# Altium footprint library NG2092.PcbLib: 32 footprints (part 1 of 2)
Each footprint in its own frame and in the unit in brackets; x right, y up, seen from the top. Pads: shape width x height; smd on the part's side, far side on the other; paste and mask are expansions set on the pad; w line width, h text height; cw(c..) or ccw(c..) is an arc to the next point about the centre after c.
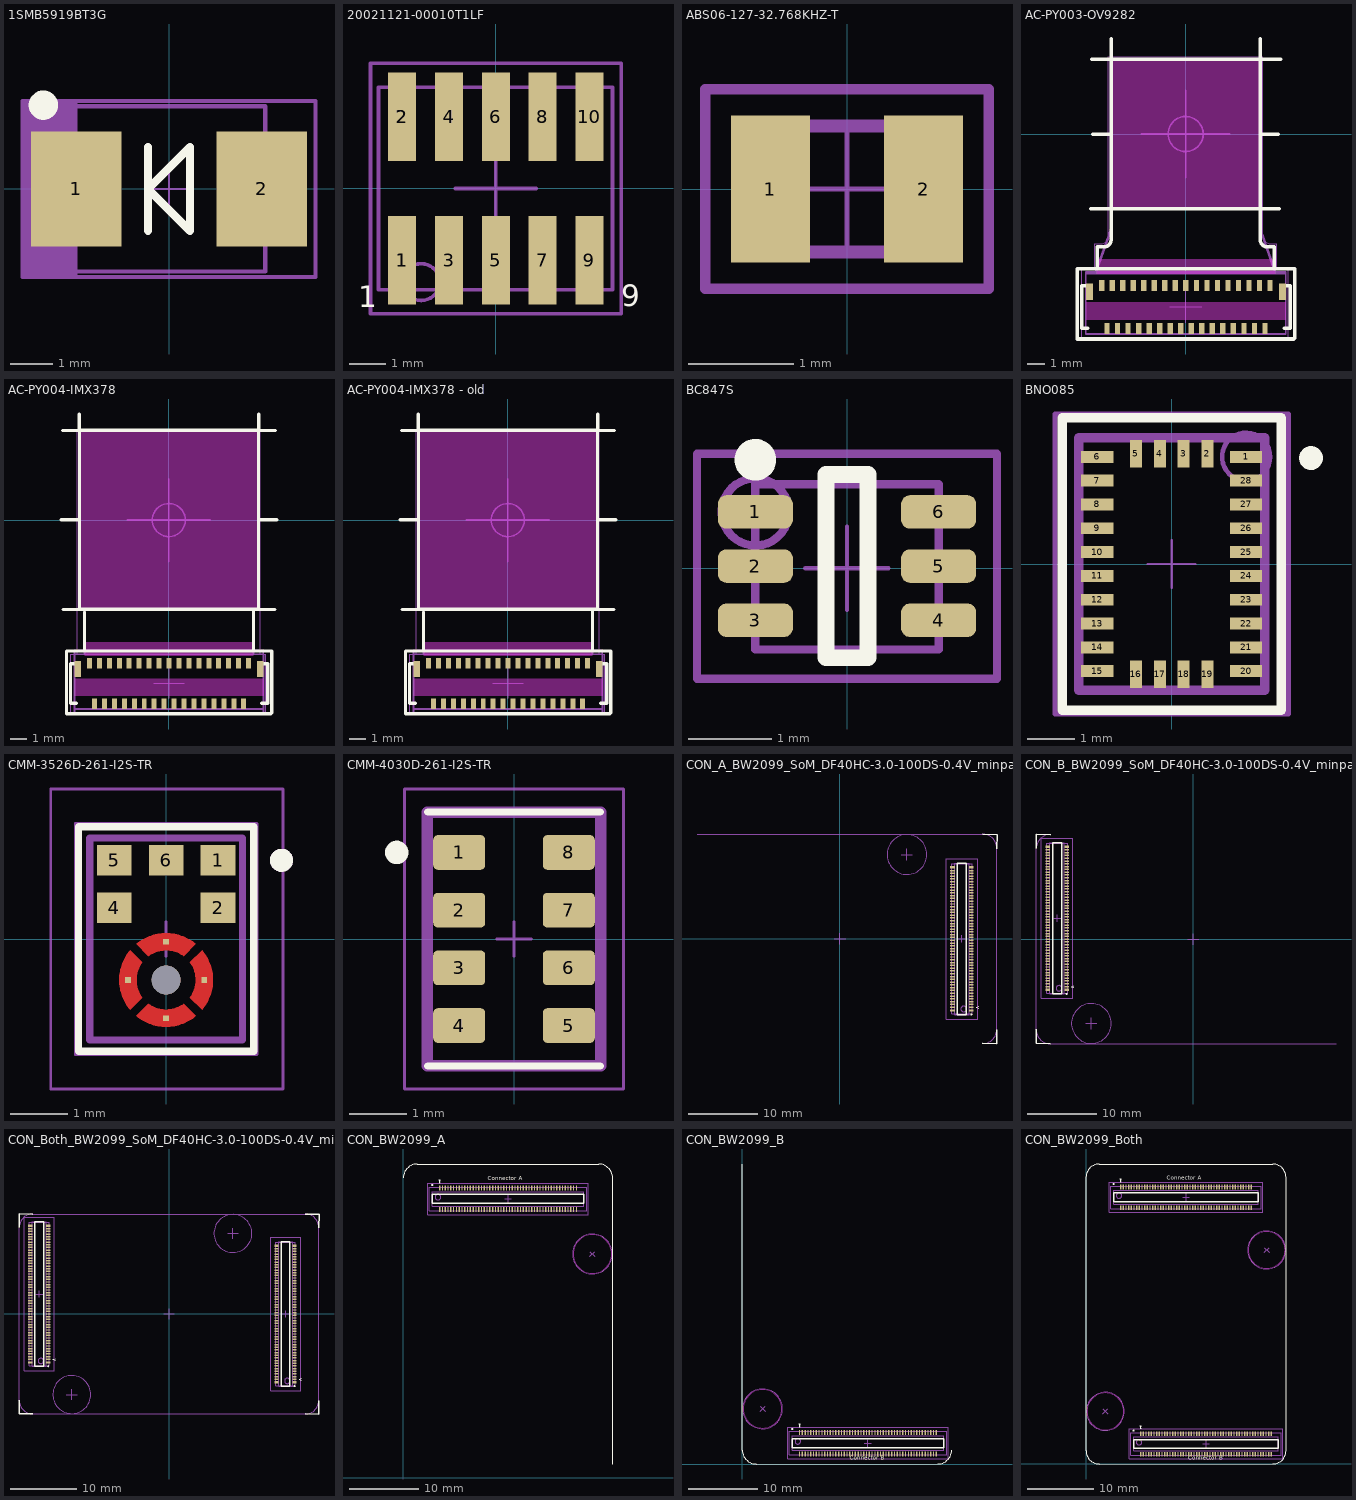
[diagram p0: the footprints below, top view; thin cyan lines are the x and y axes]

## 1SMB5919BT3G [mm] "Molded, 2-Leads, Body 4.6x3.95mm"
height 2.42
pads (2):
  rect 2.159x2.743 smd: 1(-2.21,0) 2(2.21,0)
Top Overlay:
  circle w0.5: c-3,2 r0.1
  lines w0.2: -0.5,-1 -0.5,0 ; -0.5,0 -0.5,1 -0.5,0 ; -0.5,0 0.5,1 ; -0.5,0 0.5,-1 0.5,0 ; 0.5,0 0.5,1 ; 0.5,0 0.5,1
Top Assembly:
  rectangle: -3.5,-2.106 -2.181,2.102
  lines w0.1: -3.5,-2.1 3.5,-2.1 3.5,2.1 -3.5,2.1 -3.5,-2.1
  text "'.Designator'" at -2.418,-0.227 h1
Top Courtyard (Mech15):
  lines w0.05: -0.5,0 0.5,0 ; 0,-0.5 0,0.5 ; -3.5,-2.1 3.486,-2.1 3.486,2.1 -3.5,2.1 -3.5,-2.1
Top Component Outline (Mech31):
  lines w0.1: -2.3,-1.975 2.3,-1.975 2.3,1.975 -2.3,1.975 -2.3,-1.975
3D body: height 2.42, standoff 0, extent -2.3,-1.975 2.3,1.975

## 20021121-00010T1LF [mm] "Connector Header Surface Mount 10 position 0.050\" (1.27mm)   Contact length: 0.120\" (3.05mm)"
height 4
pads (12):
  rect 0.76x2.4 smd: 1(-2.54,-1.95) 1(-2.54,-1.95) 2(-2.54,1.95) 2(-2.54,1.95) 3(-1.27,-1.95) 4(-1.27,1.95) 5(0,-1.95) 6(0,1.95) 7(1.27,-1.95) 8(1.27,1.95) 9(2.54,-1.95) 10(2.54,1.95)
Top Overlay:
  text "1" at -3.737,-3.429 h1
  text "9" at 3.4,-3.4 h1
Top Assembly:
  lines w0.1: -3.4,-3.4 3.4,-3.4 3.4,3.4 -3.4,3.4 -3.4,-3.4 ; -1.524,-2.54 ccw(c-2.024,-2.54) -1.524,-2.54
  text "'.Designator'" at -2.418,-0.227 h1
Top Courtyard (Mech15):
  lines w0.05: -3.4,-3.4 -3.4,3.4 3.4,3.4 3.4,-3.4 -3.4,-3.4
  lines w0.1: -1.1,0 0,0 ; 0,-1.1 0,0 ; 0,1.1 0,0 ; 1.1,0 0,0
Top Component Outline (Mech31):
  lines w0.1: -3.184,-2.75 -3.184,2.75 3.166,2.75 3.166,-2.75 -3.184,-2.75
3D body "20021121-00010T1LF.stp": height 4.55, standoff 0, extent -3.184,-2.75 3.166,2.75

## ABS06-127-32.768KHZ-T [mm] "2-SMD 0.079\" L x 0.047\" W (2.00mm x 1.20mm)"
height 0.6
pads (2):
  rect 0.75x1.4 smd: 1(-0.73,0) 2(0.73,0)
Top Assembly:
  lines w0.1: -1.35,-0.95 1.35,-0.95 1.35,0.95 -1.35,0.95 -1.35,-0.95
  text "'.Designator'" at -2.418,-0.227 h1
Top Courtyard (Mech15):
  lines w0.05: -0.6,0 0,0 ; 0,-0.6 0,0 ; 0,0.6 0,0 ; 0.6,0 0,0 ; -1.35,-0.95 1.35,-0.95 1.35,0.95 -1.35,0.95 -1.35,-0.95
Top Component Outline (Mech31):
  lines w0.127: -1,-0.6 1,-0.6 1,0.6 -1,0.6 -1,-0.6
3D body "ABS06-32.768KHZ-9-T--3DModel-STEP-56544.STEP": height 0.65, standoff 0.05, extent -1,-0.6 1,0.6

## AC-PY003-OV9282 [mm] "connector: FH26W-33S-0.3SHW"
pads (35):
  rect 0.4x0.95 smd mask+0.05: 0(-5.488,-8.984) 0(5.512,-8.984)
  rect 0.3x0.65 smd mask+0.05: 1(4.812,-8.634) 2(4.52,-11.084) 3(4.212,-8.634) 4(3.92,-11.084) 5(3.612,-8.634) 6(3.32,-11.084) 7(3.012,-8.634) 8(2.72,-11.084) 9(2.412,-8.634) 10(2.12,-11.084) 11(1.812,-8.634) 12(1.52,-11.084) 13(1.212,-8.634) 14(0.92,-11.084) 15(0.612,-8.634) 16(0.32,-11.084) 17(0.012,-8.634) 18(-0.28,-11.084) 19(-0.588,-8.634) 20(-0.88,-11.084) 21(-1.188,-8.634) 22(-1.48,-11.084) 23(-1.788,-8.634) 24(-2.08,-11.084) 25(-2.388,-8.634) 26(-2.68,-11.084) 27(-2.988,-8.634) 28(-3.28,-11.084) 29(-3.588,-8.634) 30(-3.88,-11.084) 31(-4.188,-8.634) 32(-4.48,-11.084) 33(-4.788,-8.634)
Top Layer keep-out:
  rectangle: -5.088,-7.981 5.131,-7.138
  rectangle: -5.688,-10.602 5.73,-9.573
  rectangle: -4.2,-4.2 4.3,4.2
Top Overlay:
  lines w0.2: -6.175,-7.684 -6.175,-11.684 6.162,-11.684 6.215,-11.632 6.215,-7.684 -6.148,-7.684 ; -5.575,-11.059 -5.925,-11.059 -5.925,-8.659 -5.575,-8.659 ; -5.412,-4.25 5.348,-4.25 ; -5.348,4.25 5.412,4.25 ; -5.288,0 -4.288,0 ; -5.043,-7.684 -5.043,-6.431 -4.669,-6.431 ccw(c-4.65,-6.031) -4.25,-6.05 -4.25,5.416 ; 4.252,5.416 4.252,-6.05 ccw(c4.652,-6.031) 4.671,-6.431 5.046,-6.431 5.046,-7.684 ; 4.288,0 5.288,0 ; 5.615,-11.059 5.965,-11.059 5.965,-8.659 5.615,-8.659
Top Assembly:
  circle w0.1: c0,0 r1
  lines w0.1: -2.51,0 2.51,0 ; 0,-2.5 0,2.5 ; -5.688,-11.397 -5.688,-7.859 -2.738,-7.859 2.762,-7.859 5.7,-7.859 5.7,-11.397 -5.688,-11.397
  lines w0.15: -5.112,-7.882 -4.25,-5.408 ; -4.248,-5.408 -4.248,-4.246 ; 4.248,-5.41 4.248,-4.248 ; 4.25,-5.41 5.112,-7.884 ; 4.252,4.25 -4.252,4.25 -4.252,-4.248 4.252,-4.248 4.252,4.252
  text "'.Designator'" at -2.418,-9.977 h1
Top Courtyard (Mech15):
  lines w0.05: -5.193,-7.656 -5.193,-6.246 -4.819,-6.246 ccw(c-4.8,-5.847) -4.4,-5.866 -4.4,4.4 4.4,4.4 ; -0.91,0 0,0 ; -0.898,-9.853 0.012,-9.853 ; 0,-0.91 0,0 ; 0,0.91 0,0 ; 0.012,-10.763 0.012,-9.853 ; 0.012,-8.943 0.012,-9.853 ; 0.91,0 0,0 ; 0.922,-9.853 0.012,-9.853 ; 4.407,4.4 4.407,-5.866 ccw(c4.806,-5.847) 4.825,-6.246 5.2,-6.246 5.2,-7.656 ; -5.913,-11.584 -5.913,-7.684 5.854,-7.684 5.854,-11.584 -5.913,-11.584
Top Component Outline (Mech31):
  lines w0.1: -5.112,-7.882 -4.25,-5.408 ; -4.252,-4.248 -4.252,4.25 4.252,4.25 ; -4.248,-5.408 -4.248,-4.246 ; 4.248,-5.41 4.248,-4.248 ; 4.25,-5.41 5.112,-7.884 ; 4.252,-4.248 4.252,4.252 ; -5.688,-11.397 5.712,-11.397 5.712,-7.947 -5.688,-7.947 -5.688,-11.397
3D body: height 5.2, standoff 5.15, extent -5.1,-0.007 5.1,0.006
3D body: height 5.2, standoff 5.15, extent -0.006,-5.1 0.007,5.1
3D body "arducam-PY003-OV9282_0705.stp": height 5.15, standoff 0.25, extent -5.1,-10.42 5.1,4.25
3D body "FH26-33S-0.step": height 1.01, standoff 0.01, extent -5.688,-11.434 5.712,-7.934

## AC-PY004-IMX378 [mm] "connector: FH26W-33S-0.3SHW"
pads (35):
  rect 0.4x0.95 smd mask+0.05: 0(-5.488,-8.984) 0(5.512,-8.984)
  rect 0.3x0.65 smd mask+0.05: 1(4.812,-8.634) 2(4.52,-11.084) 3(4.212,-8.634) 4(3.92,-11.084) 5(3.612,-8.634) 6(3.32,-11.084) 7(3.012,-8.634) 8(2.72,-11.084) 9(2.412,-8.634) 10(2.12,-11.084) 11(1.812,-8.634) 12(1.52,-11.084) 13(1.212,-8.634) 14(0.92,-11.084) 15(0.612,-8.634) 16(0.32,-11.084) 17(0.012,-8.634) 18(-0.28,-11.084) 19(-0.588,-8.634) 20(-0.88,-11.084) 21(-1.188,-8.634) 22(-1.48,-11.084) 23(-1.788,-8.634) 24(-2.08,-11.084) 25(-2.388,-8.634) 26(-2.68,-11.084) 27(-2.988,-8.634) 28(-3.28,-11.084) 29(-3.588,-8.634) 30(-3.88,-11.084) 31(-4.188,-8.634) 32(-4.48,-11.084) 33(-4.788,-8.634)
Top Layer keep-out:
  rectangle: -5.388,-5.436 5.412,5.4
  rectangle: -5.688,-10.602 5.73,-9.573
  rectangle: -5.1,-8.2 5.119,-7.357
Top Overlay:
  lines w0.2: -6.496,0.016 -5.496,0.016 ; -6.4,5.4 -5.4,5.4 -5.4,6.4 ; -6.372,-5.397 -5.372,-5.397 ; -5.575,-11.059 -5.925,-11.059 -5.925,-8.659 -5.575,-8.659 ; -5.088,-7.872 -5.088,-5.559 ; 5.112,-7.9 5.112,-5.384 ; 5.397,-5.397 6.397,-5.397 ; 5.424,6.4 5.424,5.4 6.424,5.4 ; 5.52,0.016 6.52,0.016 ; 5.615,-11.059 5.965,-11.059 5.965,-8.659 5.615,-8.659 ; -6.175,-11.684 6.162,-11.684 6.215,-11.632 6.215,-7.9 -6.175,-7.9 -6.175,-11.684 ; -5.388,-5.384 -5.388,5.416 5.412,5.416 5.412,-5.384 -5.388,-5.384
Top Assembly:
  circle w0.1: c0,0 r1
  lines w0.1: -5.387,5.374 -5.387,-5.41 5.397,-5.41 ; -5.347,5.373 5.437,5.373 5.437,-5.411 ; -5.094,-7.868 -5.087,-5.411 ; -2.51,0 2.51,0 ; 0,-2.5 0,2.5 ; 5.113,-7.911 5.113,-5.411 ; -5.688,-11.397 5.7,-11.397 5.7,-7.859 2.762,-7.859 -2.738,-7.859 -5.688,-7.859 -5.688,-11.397
  text "'.Designator'" at -2.418,-9.977 h1
Top Courtyard (Mech15):
  lines w0.05: -5.532,-8.083 -5.532,5.4 5.532,5.4 5.532,-8.098 ; -0.91,0 0,0 ; -0.898,-9.853 0.012,-9.853 ; 0,-0.91 0,0 ; 0,0.91 0,0 ; 0.012,-10.763 0.012,-9.853 ; 0.012,-8.943 0.012,-9.853 ; 0.91,0 0,0 ; 0.922,-9.853 0.012,-9.853 ; -5.913,-11.584 5.854,-11.584 5.854,-8.1 -5.913,-8.1 -5.913,-11.584
Top Component Outline (Mech31):
  lines w0.1: -5.388,5.401 -5.388,-5.383 5.397,-5.383 ; -5.348,5.4 5.436,5.4 5.436,-5.384 ; -5.088,-5.384 -5.086,-8.096 ; 5.11,-8.099 5.112,-5.384 ; -5.688,-11.7 -5.688,-8.1 5.712,-8.1 5.712,-11.7 -5.688,-11.7
3D body "20210802_Ard-pcpy004-imx378.stp": height 6.5, standoff 0.25, extent -5.4,-10.42 5.4,5.4
3D body "FH26-33S-0.step": height 1.01, standoff 0.01, extent -5.688,-11.434 5.712,-7.934
3D body: height 6.55, standoff 6.5, extent -5.1,-0.007 5.1,0.006
3D body: height 6.55, standoff 6.5, extent -0.006,-5.1 0.007,5.1

## AC-PY004-IMX378 - old [mm] "connector: FH26W-33S-0.3SHW"
pads (35):
  rect 0.4x0.95 smd mask+0.05: 0(-5.488,-8.984) 0(5.512,-8.984)
  rect 0.3x0.65 smd mask+0.05: 1(4.812,-8.634) 2(4.52,-11.084) 3(4.212,-8.634) 4(3.92,-11.084) 5(3.612,-8.634) 6(3.32,-11.084) 7(3.012,-8.634) 8(2.72,-11.084) 9(2.412,-8.634) 10(2.12,-11.084) 11(1.812,-8.634) 12(1.52,-11.084) 13(1.212,-8.634) 14(0.92,-11.084) 15(0.612,-8.634) 16(0.32,-11.084) 17(0.012,-8.634) 18(-0.28,-11.084) 19(-0.588,-8.634) 20(-0.88,-11.084) 21(-1.188,-8.634) 22(-1.48,-11.084) 23(-1.788,-8.634) 24(-2.08,-11.084) 25(-2.388,-8.634) 26(-2.68,-11.084) 27(-2.988,-8.634) 28(-3.28,-11.084) 29(-3.588,-8.634) 30(-3.88,-11.084) 31(-4.188,-8.634) 32(-4.48,-11.084) 33(-4.788,-8.634)
Top Layer keep-out:
  rectangle: -5.1,-8.2 5.119,-7.357
  rectangle: -5.688,-10.602 5.73,-9.573
  rectangle: -5.388,-5.436 5.412,5.4
Top Overlay:
  lines w0.2: -6.496,0.016 -5.496,0.016 ; -6.4,5.4 -5.4,5.4 -5.4,6.4 ; -6.372,-5.397 -5.372,-5.397 ; -5.575,-11.059 -5.925,-11.059 -5.925,-8.659 -5.575,-8.659 ; -5.088,-7.872 -5.088,-5.559 ; 5.112,-7.9 5.112,-5.384 ; 5.397,-5.397 6.397,-5.397 ; 5.424,6.4 5.424,5.4 6.424,5.4 ; 5.52,0.016 6.52,0.016 ; 5.615,-11.059 5.965,-11.059 5.965,-8.659 5.615,-8.659 ; -6.175,-11.684 -6.175,-7.9 6.215,-7.9 6.215,-11.632 6.162,-11.684 -6.175,-11.684 ; -5.388,-5.384 5.412,-5.384 5.412,5.416 -5.388,5.416 -5.388,-5.384
Top Assembly:
  circle w0.1: c0,0 r1
  lines w0.1: -5.387,5.374 -5.387,-5.41 5.397,-5.41 ; -5.347,5.373 5.437,5.373 5.437,-5.411 ; -5.094,-7.868 -5.087,-5.411 ; -2.51,0 2.51,0 ; 0,-2.5 0,2.5 ; 5.113,-7.911 5.113,-5.411 ; -5.688,-11.397 -5.688,-7.859 -2.738,-7.859 2.762,-7.859 5.7,-7.859 5.7,-11.397 -5.688,-11.397
  text "'.Designator'" at -2.418,-9.977 h1
Top Courtyard (Mech15):
  lines w0.05: -5.532,-8.083 -5.532,5.4 5.532,5.4 5.532,-8.098 ; -0.91,0 0,0 ; -0.898,-9.853 0.012,-9.853 ; 0,-0.91 0,0 ; 0,0.91 0,0 ; 0.012,-10.763 0.012,-9.853 ; 0.012,-8.943 0.012,-9.853 ; 0.91,0 0,0 ; 0.922,-9.853 0.012,-9.853 ; -5.913,-11.584 -5.913,-8.1 5.854,-8.1 5.854,-11.584 -5.913,-11.584
Top Component Outline (Mech31):
  lines w0.1: -5.388,5.401 -5.388,-5.383 5.397,-5.383 ; -5.348,5.4 5.436,5.4 5.436,-5.384 ; -5.088,-5.384 -5.086,-8.096 ; 5.11,-8.099 5.112,-5.384 ; -5.688,-11.7 5.712,-11.7 5.712,-8.1 -5.688,-8.1 -5.688,-11.7
3D body: height 5.6, standoff 5.55, extent -0.006,-5.1 0.007,5.1
3D body: height 5.6, standoff 5.55, extent -5.1,-0.007 5.1,0.006
3D body "FH26-33S-0.step": height 1.01, standoff 0.01, extent -5.688,-11.434 5.712,-7.934
3D body "Arducam-PY004-imx378-3D.stp": height 6.2, standoff 0.25, extent -5.4,-10.42 5.4,5.4

## BC847S [mm] "SOT363, 6-Leads, Body 2.4x2.2mm (max), Pitch 0.65mm, IPC Medium Density"
height 1.1
pads (6):
  rrect50% 0.9x0.4 smd mask+0.076: 1(-1.1,0.675) 2(-1.1,0.025) 3(-1.1,-0.625) 4(1.1,-0.625) 5(1.1,0.025) 6(1.1,0.675)
Top Overlay:
  circle w0.25: c-1.1,1.3 r0.125
  lines w0.203: -0.25,-1.075 0.25,-1.075 0.25,1.125 -0.25,1.125 -0.25,-1.075
Top Assembly:
  circle w0.1: c-1.1,0.675 r0.403
  lines w0.1: -1.8,-1.325 1.8,-1.325 1.8,1.375 -1.8,1.375 -1.8,-1.325
  text "'.Designator'" at -2.418,-0.227 h1
Top Courtyard (Mech15):
  lines w0.05: -0.5,0 0.5,0 ; 0,-0.5 0,0.5 ; -1.8,-1.325 1.8,-1.325 1.8,1.375 -1.8,1.375 -1.8,-1.325
Top Component Outline (Mech31):
  lines w0.1: -1.1,-0.975 1.1,-0.975 1.1,1.009 -1.1,1.009 -1.1,-0.975
3D body "SOT65P210X110-6N.STEP": height 0.99, standoff -0.01, extent -1.1,-0.975 1.1,1.013

## BNO085 [mm] "28-TFLGA Module (5.2x3.8)"
height 1.18
pads (28):
  rect 0.675x0.25 smd paste+0 mask+0: 1(1.562,2.25) 6(-1.562,2.25) 7(-1.562,1.75) 8(-1.562,1.25) 9(-1.562,0.75) 10(-1.562,0.25) 11(-1.562,-0.25) 12(-1.562,-0.75) 13(-1.562,-1.25) 14(-1.562,-1.75) 15(-1.562,-2.25) 20(1.562,-2.25) 21(1.562,-1.75) 22(1.562,-1.25) 23(1.562,-0.75) 24(1.562,-0.25) 25(1.562,0.25) 26(1.562,0.75) 27(1.562,1.25) 28(1.562,1.75)
  rect 0.25x0.575 smd paste+0 mask+0: 2(0.75,2.312) 3(0.25,2.312) 4(-0.25,2.312) 5(-0.75,2.312) 16(-0.75,-2.312) 17(-0.25,-2.312) 18(0.25,-2.312) 19(0.75,-2.312)
Top Overlay:
  circle w0.25: c2.925,2.225 r0.125
  lines w0.2: -2.3,-3.075 2.3,-3.075 2.3,3.075 -2.3,3.075 -2.3,-3.075
Top Assembly:
  circle w0.1: c1.562,2.25 r0.505
  lines w0.1: -2.45,-3.15 2.45,-3.15 2.45,3.15 -2.45,3.15 -2.45,-3.15
  text "'.Designator'" at -2.418,-0.227 h1
Top Courtyard (Mech15):
  lines w0.05: -0.5,0 0.5,0 ; 0,-0.5 0,0.5 ; -2.45,-3.15 2.45,-3.15 2.45,3.15 -2.45,3.15 -2.45,-3.15
Top Component Outline (Mech31):
  lines w0.2: -1.95,-2.65 1.95,-2.65 1.95,2.65 -1.95,2.65 -1.95,-2.65
3D body "IC_Hillcrest_Laboratories_Inc_BNO085_eec.STEP": height 1.18, standoff 0, extent -1.9,-2.6 1.9,2.6

## CMM-3526D-261-I2S-TR [mm]
pads (10):
  rect 0.6x0.522 smd mask+0.05: 1(0.9,1.364) 2(0.9,0.542) 4(-0.9,0.542) 5(-0.9,1.364) 6(0,1.364)
  rect 0.1x0.1 smd paste-1 mask+0: 3(-0.663,-0.71) 3(0,-1.372) 3(0,-0.048) 3(0.663,-0.71)
  round 0.5 hole 0.5 unplated: ""(0,-0.71)
Top Layer:
  region: -0.412,-0.404 -0.427,-0.425 -0.438,-0.444 -0.449,-0.462 -0.459,-0.481 -0.468,-0.501 -0.477,-0.521 -0.484,-0.541 -0.491,-0.561 -0.497,-0.582 -0.501,-0.603 -0.506,-0.624 -0.509,-0.646 -0.511,-0.667 -0.512,-0.688 -0.513,-0.71 -0.512,-0.732 -0.511,-0.753 -0.509,-0.774 -0.506,-0.796 -0.501,-0.817 -0.497,-0.838 -0.491,-0.859 -0.484,-0.879 -0.477,-0.899 -0.468,-0.919 -0.459,-0.939 -0.449,-0.958 -0.438,-0.976 -0.427,-0.995 -0.412,-1.016 -0.624,-1.228 -0.647,-1.199 -0.669,-1.168 -0.69,-1.137 -0.709,-1.105 -0.727,-1.072 -0.743,-1.038 -0.757,-1.003 -0.77,-0.968 -0.781,-0.932 -0.791,-0.896 -0.799,-0.859 -0.805,-0.822 -0.809,-0.785 -0.812,-0.747 -0.813,-0.71 -0.812,-0.673 -0.809,-0.635 -0.805,-0.598 -0.799,-0.561 -0.791,-0.524 -0.781,-0.488 -0.77,-0.452 -0.757,-0.417 -0.743,-0.382 -0.727,-0.348 -0.709,-0.315 -0.69,-0.283 -0.669,-0.252 -0.647,-0.221 -0.624,-0.192
  region: 0.518,-1.334 0.489,-1.357 0.458,-1.379 0.427,-1.4 0.395,-1.419 0.362,-1.437 0.328,-1.453 0.293,-1.467 0.258,-1.48 0.222,-1.491 0.186,-1.501 0.149,-1.509 0.112,-1.515 0.075,-1.519 0.037,-1.522 0,-1.523 -0.037,-1.522 -0.075,-1.519 -0.112,-1.515 -0.149,-1.509 -0.186,-1.501 -0.222,-1.491 -0.258,-1.48 -0.293,-1.467 -0.328,-1.453 -0.362,-1.437 -0.395,-1.419 -0.427,-1.4 -0.458,-1.379 -0.489,-1.357 -0.518,-1.334 -0.306,-1.122 -0.292,-1.132 -0.273,-1.144 -0.255,-1.155 -0.236,-1.166 -0.216,-1.175 -0.196,-1.184 -0.176,-1.192 -0.155,-1.199 -0.134,-1.205 -0.113,-1.21 -0.091,-1.215 -0.07,-1.218 -0.048,-1.22 -0.026,-1.222 -0.004,-1.223 0.017,-1.222 0.039,-1.221 0.061,-1.219 0.082,-1.216 0.104,-1.212 0.125,-1.207 0.146,-1.201 0.167,-1.195 0.188,-1.187 0.208,-1.179 0.228,-1.17 0.247,-1.16 0.266,-1.149 0.284,-1.137 0.306,-1.122
  region: 0.647,-0.221 0.669,-0.252 0.69,-0.283 0.709,-0.315 0.727,-0.348 0.743,-0.382 0.757,-0.417 0.77,-0.452 0.781,-0.488 0.791,-0.524 0.799,-0.561 0.805,-0.598 0.809,-0.635 0.812,-0.673 0.813,-0.71 0.812,-0.747 0.809,-0.785 0.805,-0.822 0.799,-0.859 0.791,-0.896 0.781,-0.932 0.77,-0.968 0.757,-1.003 0.743,-1.038 0.727,-1.072 0.709,-1.105 0.69,-1.137 0.669,-1.168 0.647,-1.199 0.624,-1.228 0.412,-1.016 0.422,-1.002 0.434,-0.983 0.445,-0.965 0.456,-0.946 0.465,-0.926 0.474,-0.906 0.482,-0.886 0.489,-0.865 0.495,-0.844 0.5,-0.823 0.505,-0.801 0.508,-0.78 0.51,-0.758 0.512,-0.736 0.513,-0.714 0.512,-0.693 0.511,-0.671 0.509,-0.649 0.506,-0.628 0.502,-0.606 0.497,-0.585 0.491,-0.564 0.485,-0.543 0.477,-0.522 0.469,-0.502 0.46,-0.482 0.45,-0.463 0.439,-0.444 0.427,-0.426 0.412,-0.404 0.624,-0.192
  region: 0.037,0.102 0.075,0.099 0.112,0.095 0.149,0.089 0.186,0.081 0.222,0.071 0.258,0.06 0.293,0.047 0.328,0.033 0.362,0.017 0.395,-0.001 0.427,-0.02 0.458,-0.041 0.489,-0.063 0.518,-0.086 0.306,-0.298 0.284,-0.283 0.266,-0.271 0.247,-0.26 0.228,-0.25 0.208,-0.241 0.188,-0.233 0.167,-0.225 0.146,-0.219 0.125,-0.213 0.104,-0.208 0.082,-0.204 0.061,-0.201 0.039,-0.199 0.017,-0.198 -0.004,-0.197 -0.026,-0.198 -0.048,-0.2 -0.07,-0.202 -0.091,-0.205 -0.113,-0.21 -0.134,-0.215 -0.155,-0.221 -0.176,-0.228 -0.196,-0.236 -0.216,-0.245 -0.236,-0.254 -0.255,-0.265 -0.273,-0.276 -0.292,-0.288 -0.306,-0.298 -0.518,-0.086 -0.489,-0.063 -0.458,-0.041 -0.427,-0.02 -0.395,-0.001 -0.362,0.017 -0.328,0.033 -0.293,0.047 -0.258,0.06 -0.222,0.071 -0.186,0.081 -0.149,0.089 -0.112,0.095 -0.075,0.099 -0.037,0.102 0,0.103
Top Overlay:
  circle w0.2: c2,1.364 r0.1
  lines w0.127: -1.52,-1.945 -1.52,1.945 1.52,1.945 1.52,-1.945 -1.52,-1.945
Top Paste:
  drawing of 4 lines, arcs and shapes, not listed
Top Solder:
  drawing of 4 lines, arcs and shapes, not listed
Top Assembly:
  lines w0.05: -1.575,-2 -1.575,2 1.575,2 1.575,-2 -1.575,-2
  text "'.Designator'" at -2.418,-0.227 h1
Top Courtyard (Mech15):
  lines w0.05: -0.3,0 0.3,0 ; 0,-0.3 0,0.3 ; -2,-2.6 -2,2.6 2.025,2.6 2.025,-2.6 -2,-2.6
Top Component Outline (Mech31):
  circle w0.2: c2,1.364 r0.1
  lines w0.127: -1.325,-1.75 -1.325,1.75 1.325,1.75 1.325,-1.75 -1.325,-1.75
3D body "CUI_DEVICES_CMM-3526D-261-I2S-TR.step": height 1.01, standoff 0.03, extent -1.325,-1.75 1.325,1.75

## CMM-4030D-261-I2S-TR [mm] "I2S MEMS MIC 4.00mm x 2.65mm"
height 1.25
pads (8):
  rrect25% 0.9x0.6 smd: 1(-0.95,1.5) 2(-0.95,0.5) 3(-0.95,-0.5) 4(-0.95,-1.5) 5(0.95,-1.5) 6(0.95,-0.5) 7(0.95,0.5) 8(0.95,1.5)
Top Overlay:
  circle w0.254: c-2.032,1.5 r0.076
  lines w0.127: -1.5,-2.2 1.5,-2.2 ; -1.5,2.2 1.5,2.2
Top Assembly:
  lines w0.05: -1.9,-2.6 1.9,-2.6 1.9,2.6 -1.9,2.6 -1.9,-2.6
  text "'.Designator'" at -2.418,-0.227 h1
Top Courtyard (Mech15):
  lines w0.05: -0.3,0 0.3,0 ; 0,-0.3 0,0.3 ; -1.9,-2.6 1.9,-2.6 1.9,2.6 -1.9,2.6 -1.9,-2.6
Top Component Outline (Mech31):
  lines w0.2: -1.5,-2.2 1.5,-2.2 1.5,2.2 -1.5,2.2 -1.5,-2.2
3D body "CUI_DEVICES_CMM-4030DT-26154-TR.step": height 1, standoff 0, extent -1.5,-2 1.5,2

## CON_A_BW2099_SoM_DF40HC-3.0-100DS-0.4V_minpad [mm] "3.0MM MATED HEIGHT CONN HDR 100POS 0.4MM SMD GOLD"
height 2.9
pads (104):
  rect 0.66x0.21 smd: 1(18.855,-9.8) 2(16.145,-9.8) 3(18.855,-9.4) 4(16.145,-9.4) 5(18.855,-9) 6(16.145,-9) 7(18.855,-8.6) 8(16.145,-8.6) 9(18.855,-8.2) 10(16.145,-8.2) 11(18.855,-7.8) 12(16.145,-7.8) 13(18.855,-7.4) 14(16.145,-7.4) 15(18.855,-7) 16(16.145,-7) 17(18.855,-6.6) 18(16.145,-6.6) 19(18.855,-6.2) 20(16.145,-6.2) 21(18.855,-5.8) 22(16.145,-5.8) 23(18.855,-5.4) 24(16.145,-5.4) 25(18.855,-5) 26(16.145,-5) 27(18.855,-4.6) 28(16.145,-4.6) 29(18.855,-4.2) 30(16.145,-4.2) 31(18.855,-3.8) 32(16.145,-3.8) 33(18.855,-3.4) 34(16.145,-3.4) 35(18.855,-3) 36(16.145,-3) 37(18.855,-2.6) 38(16.145,-2.6) 39(18.855,-2.2) 40(16.145,-2.2) 41(18.855,-1.8) 42(16.145,-1.8) 43(18.855,-1.4) 44(16.145,-1.4) 45(18.855,-1) 46(16.145,-1) 47(18.855,-0.6) 48(16.145,-0.6) 49(18.855,-0.2) 50(16.145,-0.2) 51(18.855,0.2) 52(16.145,0.2) 53(18.855,0.6) 54(16.145,0.6) 55(18.855,1) 56(16.145,1) 57(18.855,1.4) 58(16.145,1.4) 59(18.855,1.8) 60(16.145,1.8) 61(18.855,2.2) 62(16.145,2.2) 63(18.855,2.6) 64(16.145,2.6) 65(18.855,3) 66(16.145,3) 67(18.855,3.4) 68(16.145,3.4) 69(18.855,3.8) 70(16.145,3.8) 71(18.855,4.2) 72(16.145,4.2) 73(18.855,4.6) 74(16.145,4.6) 75(18.855,5) 76(16.145,5) 77(18.855,5.4) 78(16.145,5.4) 79(18.855,5.8) 80(16.145,5.8) 81(18.855,6.2) 82(16.145,6.2) 83(18.855,6.6) 84(16.145,6.6) 85(18.855,7) 86(16.145,7) 87(18.855,7.4) 88(16.145,7.4) 89(18.855,7.8) 90(16.145,7.8) 91(18.855,8.2) 92(16.145,8.2) 93(18.855,8.6) 94(16.145,8.6) 95(18.855,9) 96(16.145,9) 97(18.855,9.4) 98(16.145,9.4) 99(18.855,9.8) 100(16.145,9.8)
  rect 0.66x0.33 smd: S1(18.855,-10.265) S2(16.145,-10.265) S3(18.855,10.265) S4(16.145,10.265)
Top Overlay:
  circle w0.254: c18.855,-10.85 r0.025
  lines w0.102: 19.892,-9.915 19.55,-9.8 19.892,-9.685
  lines w0.2: 20.433,-15.002 22.466,-15.036 22.5,-13.002 ; 20.493,15 22.527,14.966 22.493,12.933 ; 16.85,-10.85 18.15,-10.85 18.15,10.85 16.85,10.85 16.85,-10.85
Top Assembly:
  circle w0.1: c17.75,-10.05 r0.4
  circle w0.1: c9.6,12.1 r2.85
  lines w0.1: -20.5,15 20.493,15 cw(c20.493,13) 22.493,13 ; -0.8,0 0,0 ; 0,-0.8 0,0 ; 0,0.8 0,0 ; 0.8,0 0,0 ; 8.8,12.1 9.6,12.1 ; 9.6,11.3 9.6,12.1 ; 9.6,12.9 9.6,12.1 ; 10.4,12.1 9.6,12.1 ; 20.497,-15.002 ccw(c20.497,-13.002) 22.497,-13.002 ; 22.5,-13.002 22.5,13 ; 16.45,-10.85 18.55,-10.85 18.55,10.85 16.45,10.85 16.45,-10.85
  text "CONNECTOR A" at 20.617,5.4 h1.52
  text "'.Designator'" at 17.2,0.817 h1
  text "BW2099 Module / <1mm clearance" at 2.2,6.9 h2
Top Courtyard (Mech15):
  lines w0.05: 17,0 18,0 ; 17.5,-0.5 17.5,0.5 ; 15.25,-11.5 15.25,11.5 19.75,11.5 19.75,-11.5 15.25,-11.5
Top Component Outline (Mech31):
  circle w0.1: c9.6,12.1 r2.85
  lines w0.102: 16.02,-10.76 18.99,-10.76 18.99,10.76 16.02,10.76 16.02,-10.76
3D body "DF40C-100DP.stp": height 1.12, standoff -0.02, extent 16.02,-10.76 18.99,10.76

## CON_B_BW2099_SoM_DF40HC-3.0-100DS-0.4V_minpad [mm] "3.0MM MATED HEIGHT CONN HDR 100POS 0.4MM SMD GOLD"
height 2.9
pads (104):
  rect 0.66x0.21 smd: 1(-18.145,-6.8) 2(-20.855,-6.8) 3(-18.145,-6.4) 4(-20.855,-6.4) 5(-18.145,-6) 6(-20.855,-6) 7(-18.145,-5.6) 8(-20.855,-5.6) 9(-18.145,-5.2) 10(-20.855,-5.2) 11(-18.145,-4.8) 12(-20.855,-4.8) 13(-18.145,-4.4) 14(-20.855,-4.4) 15(-18.145,-4) 16(-20.855,-4) 17(-18.145,-3.6) 18(-20.855,-3.6) 19(-18.145,-3.2) 20(-20.855,-3.2) 21(-18.145,-2.8) 22(-20.855,-2.8) 23(-18.145,-2.4) 24(-20.855,-2.4) 25(-18.145,-2) 26(-20.855,-2) 27(-18.145,-1.6) 28(-20.855,-1.6) 29(-18.145,-1.2) 30(-20.855,-1.2) 31(-18.145,-0.8) 32(-20.855,-0.8) 33(-18.145,-0.4) 34(-20.855,-0.4) 35(-18.145,0) 36(-20.855,0) 37(-18.145,0.4) 38(-20.855,0.4) 39(-18.145,0.8) 40(-20.855,0.8) 41(-18.145,1.2) 42(-20.855,1.2) 43(-18.145,1.6) 44(-20.855,1.6) 45(-18.145,2) 46(-20.855,2) 47(-18.145,2.4) 48(-20.855,2.4) 49(-18.145,2.8) 50(-20.855,2.8) 51(-18.145,3.2) 52(-20.855,3.2) 53(-18.145,3.6) 54(-20.855,3.6) 55(-18.145,4) 56(-20.855,4) 57(-18.145,4.4) 58(-20.855,4.4) 59(-18.145,4.8) 60(-20.855,4.8) 61(-18.145,5.2) 62(-20.855,5.2) 63(-18.145,5.6) 64(-20.855,5.6) 65(-18.145,6) 66(-20.855,6) 67(-18.145,6.4) 68(-20.855,6.4) 69(-18.145,6.8) 70(-20.855,6.8) 71(-18.145,7.2) 72(-20.855,7.2) 73(-18.145,7.6) 74(-20.855,7.6) 75(-18.145,8) 76(-20.855,8) 77(-18.145,8.4) 78(-20.855,8.4) 79(-18.145,8.8) 80(-20.855,8.8) 81(-18.145,9.2) 82(-20.855,9.2) 83(-18.145,9.6) 84(-20.855,9.6) 85(-18.145,10) 86(-20.855,10) 87(-18.145,10.4) 88(-20.855,10.4) 89(-18.145,10.8) 90(-20.855,10.8) 91(-18.145,11.2) 92(-20.855,11.2) 93(-18.145,11.6) 94(-20.855,11.6) 95(-18.145,12) 96(-20.855,12) 97(-18.145,12.4) 98(-20.855,12.4) 99(-18.145,12.8) 100(-20.855,12.8)
  rect 0.66x0.33 smd: S1(-18.145,-7.265) S2(-20.855,-7.265) S3(-18.145,13.265) S4(-20.855,13.265)
Top Overlay:
  circle w0.254: c-18.145,-7.85 r0.025
  lines w0.102: -17.108,-6.915 -17.45,-6.8 -17.108,-6.685
  lines w0.2: -22.5,-12.932 -22.534,-14.966 -20.5,-15 ; -22.5,13.001 -22.466,15.035 -20.433,15.001 ; -20.15,-7.85 -18.85,-7.85 -18.85,13.85 -20.15,13.85 -20.15,-7.85
Top Assembly:
  circle w0.1: c-19.25,-7.05 r0.4
  circle w0.1: c-14.6,-12.1 r2.85
  lines w0.1: -20.5,-15 20.497,-15 ; -20.5,-14.994 cw(c-20.5,-12.994) -22.5,-12.994 -22.5,13.001 cw(c-20.5,13.001) -20.5,15.001 ; -15.4,-12.1 -14.6,-12.1 ; -14.6,-12.9 -14.6,-12.1 ; -14.6,-11.3 -14.6,-12.1 ; -13.8,-12.1 -14.6,-12.1 ; -0.8,0 0,0 ; 0,-0.8 0,0 ; 0,0.8 0,0 ; 0.8,0 0,0 ; -20.55,-7.85 -18.45,-7.85 -18.45,13.85 -20.55,13.85 -20.55,-7.85
  text "'.Designator'" at -19.8,3.817 h1
  text "CONNECTOR B" at -21.416,-2.4 h1.52
Top Courtyard (Mech15):
  lines w0.05: -20,3 -19,3 ; -19.5,2.5 -19.5,3.5 ; -21.75,-8.5 -21.75,14.5 -17.25,14.5 -17.25,-8.5 -21.75,-8.5
Top Component Outline (Mech31):
  circle w0.1: c-14.6,-12.1 r2.85
  lines w0.1: -20.98,-7.76 -18.01,-7.76 -18.01,13.76 -20.98,13.76 -20.98,-7.76
3D body "DF40C-100DP.stp": height 1.12, standoff -0.02, extent -20.98,-7.76 -18.01,13.76

## CON_Both_BW2099_SoM_DF40HC-3.0-100DS-0.4V_minpad [mm] "3.0MM MATED HEIGHT CONN HDR 100POS 0.4MM SMD GOLD"
height 2.9
pads (208):
  rect 0.66x0.21 smd: 1(-18.145,-6.8) 1(18.855,-9.8) 2(-20.855,-6.8) 2(16.145,-9.8) 3(-18.145,-6.4) 3(18.855,-9.4) 4(-20.855,-6.4) 4(16.145,-9.4) 5(-18.145,-6) 5(18.855,-9) 6(-20.855,-6) 6(16.145,-9) 7(-18.145,-5.6) 7(18.855,-8.6) 8(-20.855,-5.6) 8(16.145,-8.6) 9(-18.145,-5.2) 9(18.855,-8.2) 10(-20.855,-5.2) 10(16.145,-8.2) 11(-18.145,-4.8) 11(18.855,-7.8) 12(-20.855,-4.8) 12(16.145,-7.8) 13(-18.145,-4.4) 13(18.855,-7.4) 14(-20.855,-4.4) 14(16.145,-7.4) 15(-18.145,-4) 15(18.855,-7) 16(-20.855,-4) 16(16.145,-7) 17(-18.145,-3.6) 17(18.855,-6.6) 18(-20.855,-3.6) 18(16.145,-6.6) 19(-18.145,-3.2) 19(18.855,-6.2) 20(-20.855,-3.2) 20(16.145,-6.2) 21(-18.145,-2.8) 21(18.855,-5.8) 22(-20.855,-2.8) 22(16.145,-5.8) 23(-18.145,-2.4) 23(18.855,-5.4) 24(-20.855,-2.4) 24(16.145,-5.4) 25(-18.145,-2) 25(18.855,-5) 26(-20.855,-2) 26(16.145,-5) 27(-18.145,-1.6) 27(18.855,-4.6) 28(-20.855,-1.6) 28(16.145,-4.6) 29(-18.145,-1.2) 29(18.855,-4.2) 30(-20.855,-1.2) 30(16.145,-4.2) 31(-18.145,-0.8) 31(18.855,-3.8) 32(-20.855,-0.8) 32(16.145,-3.8) 33(-18.145,-0.4) 33(18.855,-3.4) 34(-20.855,-0.4) 34(16.145,-3.4) 35(-18.145,0) 35(18.855,-3) 36(-20.855,0) 36(16.145,-3) 37(-18.145,0.4) 37(18.855,-2.6) 38(-20.855,0.4) 38(16.145,-2.6) 39(-18.145,0.8) 39(18.855,-2.2) 40(-20.855,0.8) 40(16.145,-2.2) 41(-18.145,1.2) 41(18.855,-1.8) 42(-20.855,1.2) 42(16.145,-1.8) 43(-18.145,1.6) 43(18.855,-1.4) 44(-20.855,1.6) 44(16.145,-1.4) 45(-18.145,2) 45(18.855,-1) 46(-20.855,2) 46(16.145,-1) 47(-18.145,2.4) 47(18.855,-0.6) 48(-20.855,2.4) 48(16.145,-0.6) 49(-18.145,2.8) 49(18.855,-0.2) 50(-20.855,2.8) 50(16.145,-0.2) 51(-18.145,3.2) 51(18.855,0.2) 52(-20.855,3.2) 52(16.145,0.2) 53(-18.145,3.6) 53(18.855,0.6) 54(-20.855,3.6) 54(16.145,0.6) 55(-18.145,4) 55(18.855,1) 56(-20.855,4) 56(16.145,1) 57(-18.145,4.4) 57(18.855,1.4) 58(-20.855,4.4) 58(16.145,1.4) 59(-18.145,4.8) 59(18.855,1.8) 60(-20.855,4.8) 60(16.145,1.8) 61(-18.145,5.2) 61(18.855,2.2) 62(-20.855,5.2) 62(16.145,2.2) 63(-18.145,5.6) 63(18.855,2.6) 64(-20.855,5.6) 64(16.145,2.6) 65(-18.145,6) 65(18.855,3) 66(-20.855,6) 66(16.145,3) 67(-18.145,6.4) 67(18.855,3.4) 68(-20.855,6.4) 68(16.145,3.4) 69(-18.145,6.8) 69(18.855,3.8) 70(-20.855,6.8) 70(16.145,3.8) 71(-18.145,7.2) 71(18.855,4.2) 72(-20.855,7.2) 72(16.145,4.2) 73(-18.145,7.6) 73(18.855,4.6) 74(-20.855,7.6) 74(16.145,4.6) 75(-18.145,8) 75(18.855,5) 76(-20.855,8) 76(16.145,5) 77(-18.145,8.4) 77(18.855,5.4) 78(-20.855,8.4) 78(16.145,5.4) 79(-18.145,8.8) 79(18.855,5.8) 80(-20.855,8.8) 80(16.145,5.8) 81(-18.145,9.2) 81(18.855,6.2) 82(-20.855,9.2) 82(16.145,6.2) 83(-18.145,9.6) 83(18.855,6.6) 84(-20.855,9.6) 84(16.145,6.6) 85(-18.145,10) 85(18.855,7) 86(-20.855,10) 86(16.145,7) 87(-18.145,10.4) 87(18.855,7.4) 88(-20.855,10.4) 88(16.145,7.4) 89(-18.145,10.8) 89(18.855,7.8) 90(-20.855,10.8) 90(16.145,7.8) 91(-18.145,11.2) 91(18.855,8.2) 92(-20.855,11.2) 92(16.145,8.2) 93(-18.145,11.6) 93(18.855,8.6) 94(-20.855,11.6) 94(16.145,8.6) 95(-18.145,12) 95(18.855,9) 96(-20.855,12) 96(16.145,9) 97(-18.145,12.4) 97(18.855,9.4) 98(-20.855,12.4) 98(16.145,9.4) 99(-18.145,12.8) 99(18.855,9.8) 100(-20.855,12.8) 100(16.145,9.8)
  rect 0.66x0.33 smd: S1(-18.145,-7.265) S1(18.855,-10.265) S2(-20.855,-7.265) S2(16.145,-10.265) S3(-18.145,13.265) S3(18.855,10.265) S4(-20.855,13.265) S4(16.145,10.265)
Top Overlay:
  circle w0.254: c-18.145,-7.85 r0.025
  circle w0.254: c18.855,-10.85 r0.025
  lines w0.102: -17.108,-6.915 -17.45,-6.8 -17.108,-6.685 ; 19.892,-9.915 19.55,-9.8 19.892,-9.685
  lines w0.2: -22.5,-12.932 -22.534,-14.966 -20.5,-15 ; -22.5,13.001 -22.466,15.035 -20.433,15.001 ; 20.433,-15.002 22.466,-15.036 22.5,-13.002 ; 20.493,15 22.527,14.966 22.493,12.933 ; -20.15,-7.85 -18.85,-7.85 -18.85,13.85 -20.15,13.85 -20.15,-7.85 ; 16.85,-10.85 16.85,10.85 18.15,10.85 18.15,-10.85 16.85,-10.85
Top Assembly:
  circle w0.1: c-19.25,-7.05 r0.4
  circle w0.1: c-14.6,-12.1 r2.85
  circle w0.1: c9.6,12.1 r2.85
  circle w0.1: c17.75,-10.05 r0.4
  lines w0.1: -20.5,-15 20.497,-15 ; -20.5,-14.994 cw(c-20.5,-12.994) -22.5,-12.994 -22.5,13.001 cw(c-20.5,13.001) -20.5,15.001 ; -20.5,15 20.493,15 cw(c20.493,13) 22.493,13 ; -15.4,-12.1 -14.6,-12.1 ; -14.6,-12.9 -14.6,-12.1 ; -14.6,-11.3 -14.6,-12.1 ; -13.8,-12.1 -14.6,-12.1 ; 8.8,12.1 9.6,12.1 ; 9.6,11.3 9.6,12.1 ; 9.6,12.9 9.6,12.1 ; 10.4,12.1 9.6,12.1 ; 20.497,-15.002 ccw(c20.497,-13.002) 22.497,-13.002 ; 22.5,-13.002 22.5,13 ; 0,0 0.8,0 0,0 ; 0,0 0,-0.8 0,0 ; 0,0 -0.8,0 0,0 ; 0,0 0,0.8 0,0 ; -20.55,-7.85 -18.45,-7.85 -18.45,13.85 -20.55,13.85 -20.55,-7.85 ; 16.45,-10.85 16.45,10.85 18.55,10.85 18.55,-10.85 16.45,-10.85
  text "'.Designator'" at -19.8,3.817 h1
  text "CONNECTOR B" at -21.416,-2.4 h1.52
  text "BW2099 Module / <1mm clearance" at 2.2,6.9 h2
  text "'.Designator'" at 17.2,0.817 h1
  text "CONNECTOR A" at 20.617,5.4 h1.52
Top Courtyard (Mech15):
  lines w0.05: -20,3 -19,3 ; -19.5,2.5 -19.5,3.5 ; 17,0 18,0 ; 17.5,-0.5 17.5,0.5 ; -21.75,-8.5 -21.75,14.5 -17.25,14.5 -17.25,-8.5 -21.75,-8.5 ; 15.25,-11.5 19.75,-11.5 19.75,11.5 15.25,11.5 15.25,-11.5
Top Component Outline (Mech31):
  circle w0.1: c-14.6,-12.1 r2.85
  circle w0.1: c9.6,12.1 r2.85
  lines w0.1: -20.98,-7.76 -18.01,-7.76 -18.01,13.76 -20.98,13.76 -20.98,-7.76
  lines w0.102: 16.02,-10.76 16.02,10.76 18.99,10.76 18.99,-10.76 16.02,-10.76
3D body "DF40C-100DP.stp": height 1.12, standoff -0.02, extent 16.02,-10.76 18.99,10.76
3D body "DF40C-100DP.stp": height 1.12, standoff -0.02, extent -20.98,-7.76 -18.01,13.76

## CON_BW2099_A [mm]
pads (100):
  rect 0.18x0.7 smd: 1(5.2,41.54) 2(5.2,38.46) 3(5.6,41.54) 4(5.6,38.46) 5(6,41.54) 6(6,38.46) 7(6.4,41.54) 8(6.4,38.46) 9(6.8,41.54) 10(6.8,38.46) 11(7.2,41.54) 12(7.2,38.46) 13(7.6,41.54) 14(7.6,38.46) 15(8,41.54) 16(8,38.46) 17(8.4,41.54) 18(8.4,38.46) 19(8.8,41.54) 20(8.8,38.46) 21(9.2,41.54) 22(9.2,38.46) 23(9.6,41.54) 24(9.6,38.46) 25(10,41.54) 26(10,38.46) 27(10.4,41.54) 28(10.4,38.46) 29(10.8,41.54) 30(10.8,38.46) 31(11.2,41.54) 32(11.2,38.46) 33(11.6,41.54) 34(11.6,38.46) 35(12,41.54) 36(12,38.46) 37(12.4,41.54) 38(12.4,38.46) 39(12.8,41.54) 40(12.8,38.46) 41(13.2,41.54) 42(13.2,38.46) 43(13.6,41.54) 44(13.6,38.46) 45(14,41.54) 46(14,38.46) 47(14.4,41.54) 48(14.4,38.46) 49(14.8,41.54) 50(14.8,38.46) 51(15.2,41.54) 52(15.2,38.46) 53(15.6,41.54) 54(15.6,38.46) 55(16,41.54) 56(16,38.46) 57(16.4,41.54) 58(16.4,38.46) 59(16.8,41.54) 60(16.8,38.46) 61(17.2,41.54) 62(17.2,38.46) 63(17.6,41.54) 64(17.6,38.46) 65(18,41.54) 66(18,38.46) 67(18.4,41.54) 68(18.4,38.46) 69(18.8,41.54) 70(18.8,38.46) 71(19.2,41.54) 72(19.2,38.46) 73(19.6,41.54) 74(19.6,38.46) 75(20,41.54) 76(20,38.46) 77(20.4,41.54) 78(20.4,38.46) 79(20.8,41.54) 80(20.8,38.46) 81(21.2,41.54) 82(21.2,38.46) 83(21.6,41.54) 84(21.6,38.46) 85(22,41.54) 86(22,38.46) 87(22.4,41.54) 88(22.4,38.46) 89(22.8,41.54) 90(22.8,38.46) 91(23.2,41.54) 92(23.2,38.46) 93(23.6,41.54) 94(23.6,38.46) 95(24,41.54) 96(24,38.46) 97(24.4,41.54) 98(24.4,38.46) 99(24.8,41.54) 100(24.8,38.46)
Top Layer keep-out:
  circle w0.1: c27.1,32.1 r2.75
Top Overlay:
  circle w0.254: c4.15,42 r0.025
  lines w0.1: -0.002,42.997 cw(c1.998,42.997) 1.998,44.997 ; 1.998,45 28,45 ; 28,44.993 cw(c28,42.993) 30,42.993 30,2
  lines w0.102: 5.085,42.75 5.2,42.25 5.315,42.75
  lines w0.2: 4.15,39.35 4.15,40.65 25.85,40.65 25.85,39.35 4.15,39.35
  text "Connector A" at 12.089,42.429 h1
Top Assembly:
  circle w0.1: c4.95,40.25 r0.4
  circle w0.1: c27.1,32.1 r2.85
  lines w0.1: 4.15,38.95 4.15,41.05 25.85,41.05 25.85,38.95 4.15,38.95
  text "'.Designator'" at 15,40 h1
Top Courtyard (Mech15):
  circle w0.05: c27.1,32.1 r2.85
  circle w0.05: c27.1,32.1 r2.85
  lines w0.05: 26.746,31.747 27.454,32.454 ; 26.746,32.454 27.454,31.747 ; 3.5,37.75 26.5,37.75 26.5,42.25 3.5,42.25 3.5,37.75 ; 14.5,40 15.5,40 14.5,40 ; 15,39.5 15,40.5 15,39.5
Top Component Outline (Mech31):
  lines w0.1: 3.705,38.31 3.705,41.69 26.305,41.69 26.305,38.31 3.705,38.31
3D body "DF40HC(3.0)-100DS-0.4V.stp": height 2.85, standoff -0.05, extent 3.705,38.31 26.305,41.69

## CON_BW2099_B [mm]
pads (100):
  rect 0.18x0.7 smd: 1(8.2,4.54) 2(8.2,1.46) 3(8.6,4.54) 4(8.6,1.46) 5(9,4.54) 6(9,1.46) 7(9.4,4.54) 8(9.4,1.46) 9(9.8,4.54) 10(9.8,1.46) 11(10.2,4.54) 12(10.2,1.46) 13(10.6,4.54) 14(10.6,1.46) 15(11,4.54) 16(11,1.46) 17(11.4,4.54) 18(11.4,1.46) 19(11.8,4.54) 20(11.8,1.46) 21(12.2,4.54) 22(12.2,1.46) 23(12.6,4.54) 24(12.6,1.46) 25(13,4.54) 26(13,1.46) 27(13.4,4.54) 28(13.4,1.46) 29(13.8,4.54) 30(13.8,1.46) 31(14.2,4.54) 32(14.2,1.46) 33(14.6,4.54) 34(14.6,1.46) 35(15,4.54) 36(15,1.46) 37(15.4,4.54) 38(15.4,1.46) 39(15.8,4.54) 40(15.8,1.46) 41(16.2,4.54) 42(16.2,1.46) 43(16.6,4.54) 44(16.6,1.46) 45(17,4.54) 46(17,1.46) 47(17.4,4.54) 48(17.4,1.46) 49(17.8,4.54) 50(17.8,1.46) 51(18.2,4.54) 52(18.2,1.46) 53(18.6,4.54) 54(18.6,1.46) 55(19,4.54) 56(19,1.46) 57(19.4,4.54) 58(19.4,1.46) 59(19.8,4.54) 60(19.8,1.46) 61(20.2,4.54) 62(20.2,1.46) 63(20.6,4.54) 64(20.6,1.46) 65(21,4.54) 66(21,1.46) 67(21.4,4.54) 68(21.4,1.46) 69(21.8,4.54) 70(21.8,1.46) 71(22.2,4.54) 72(22.2,1.46) 73(22.6,4.54) 74(22.6,1.46) 75(23,4.54) 76(23,1.46) 77(23.4,4.54) 78(23.4,1.46) 79(23.8,4.54) 80(23.8,1.46) 81(24.2,4.54) 82(24.2,1.46) 83(24.6,4.54) 84(24.6,1.46) 85(25,4.54) 86(25,1.46) 87(25.4,4.54) 88(25.4,1.46) 89(25.8,4.54) 90(25.8,1.46) 91(26.2,4.54) 92(26.2,1.46) 93(26.6,4.54) 94(26.6,1.46) 95(27,4.54) 96(27,1.46) 97(27.4,4.54) 98(27.4,1.46) 99(27.8,4.54) 100(27.8,1.46)
Top Layer keep-out:
  circle w0.1: c2.9,7.9 r2.75
Top Overlay:
  circle w0.254: c7.15,5 r0.025
  lines w0.1: 0,2 0,42.997 ; 0.006,2 ccw(c2.006,2) 2.006,0 28.001,0 ccw(c28.001,2) 30.001,2
  lines w0.102: 8.085,5.75 8.2,5.25 8.315,5.75
  lines w0.2: 7.15,2.35 28.85,2.35 28.85,3.65 7.15,3.65 7.15,2.35
  text "Connector B" at 15.359,0.429 h1
Top Assembly:
  circle w0.1: c2.9,7.9 r2.85
  circle w0.1: c7.95,3.25 r0.4
  lines w0.1: 7.15,1.95 28.85,1.95 28.85,4.05 7.15,4.05 7.15,1.95
  text "'.Designator'" at 18,3 h1
Top Courtyard (Mech15):
  circle w0.05: c2.9,7.9 r2.85
  circle w0.05: c2.9,7.9 r2.85
  lines w0.05: 2.546,7.547 3.254,8.254 ; 2.546,8.254 3.254,7.547 ; 6.5,0.75 6.5,5.25 29.5,5.25 29.5,0.75 6.5,0.75 ; 17.5,3 18.5,3 17.5,3 ; 18,2.5 18,3.5 18,2.5
Top Component Outline (Mech31):
  lines w0.1: 6.705,1.31 29.305,1.31 29.305,4.69 6.705,4.69 6.705,1.31
3D body "DF40HC(3.0)-100DS-0.4V.stp": height 2.85, standoff -0.05, extent 6.705,1.31 29.305,4.69

## CON_BW2099_Both [mm]
pads (200):
  rect 0.18x0.7 smd: 1(5.201,41.54) 1(8.2,4.54) 2(5.201,38.46) 2(8.2,1.46) 3(5.601,41.54) 3(8.6,4.54) 4(5.601,38.46) 4(8.6,1.46) 5(6.001,41.54) 5(9,4.54) 6(6.001,38.46) 6(9,1.46) 7(6.401,41.54) 7(9.4,4.54) 8(6.401,38.46) 8(9.4,1.46) 9(6.801,41.54) 9(9.8,4.54) 10(6.801,38.46) 10(9.8,1.46) 11(7.201,41.54) 11(10.2,4.54) 12(7.201,38.46) 12(10.2,1.46) 13(7.601,41.54) 13(10.6,4.54) 14(7.601,38.46) 14(10.6,1.46) 15(8.001,41.54) 15(11,4.54) 16(8.001,38.46) 16(11,1.46) 17(8.401,41.54) 17(11.4,4.54) 18(8.401,38.46) 18(11.4,1.46) 19(8.801,41.54) 19(11.8,4.54) 20(8.801,38.46) 20(11.8,1.46) 21(9.201,41.54) 21(12.2,4.54) 22(9.201,38.46) 22(12.2,1.46) 23(9.601,41.54) 23(12.6,4.54) 24(9.601,38.46) 24(12.6,1.46) 25(10.001,41.54) 25(13,4.54) 26(10.001,38.46) 26(13,1.46) 27(10.401,41.54) 27(13.4,4.54) 28(10.401,38.46) 28(13.4,1.46) 29(10.801,41.54) 29(13.8,4.54) 30(10.801,38.46) 30(13.8,1.46) 31(11.201,41.54) 31(14.2,4.54) 32(11.201,38.46) 32(14.2,1.46) 33(11.601,41.54) 33(14.6,4.54) 34(11.601,38.46) 34(14.6,1.46) 35(12.001,41.54) 35(15,4.54) 36(12.001,38.46) 36(15,1.46) 37(12.401,41.54) 37(15.4,4.54) 38(12.401,38.46) 38(15.4,1.46) 39(12.801,41.54) 39(15.8,4.54) 40(12.801,38.46) 40(15.8,1.46) 41(13.201,41.54) 41(16.2,4.54) 42(13.201,38.46) 42(16.2,1.46) 43(13.601,41.54) 43(16.6,4.54) 44(13.601,38.46) 44(16.6,1.46) 45(14.001,41.54) 45(17,4.54) 46(14.001,38.46) 46(17,1.46) 47(14.401,41.54) 47(17.4,4.54) 48(14.401,38.46) 48(17.4,1.46) 49(14.801,41.54) 49(17.8,4.54) 50(14.801,38.46) 50(17.8,1.46) 51(15.201,41.54) 51(18.2,4.54) 52(15.201,38.46) 52(18.2,1.46) 53(15.601,41.54) 53(18.6,4.54) 54(15.601,38.46) 54(18.6,1.46) 55(16.001,41.54) 55(19,4.54) 56(16.001,38.46) 56(19,1.46) 57(16.401,41.54) 57(19.4,4.54) 58(16.401,38.46) 58(19.4,1.46) 59(16.801,41.54) 59(19.8,4.54) 60(16.801,38.46) 60(19.8,1.46) 61(17.201,41.54) 61(20.2,4.54) 62(17.201,38.46) 62(20.2,1.46) 63(17.601,41.54) 63(20.6,4.54) 64(17.601,38.46) 64(20.6,1.46) 65(18.001,41.54) 65(21,4.54) 66(18.001,38.46) 66(21,1.46) 67(18.401,41.54) 67(21.4,4.54) 68(18.401,38.46) 68(21.4,1.46) 69(18.801,41.54) 69(21.8,4.54) 70(18.801,38.46) 70(21.8,1.46) 71(19.201,41.54) 71(22.2,4.54) 72(19.201,38.46) 72(22.2,1.46) 73(19.601,41.54) 73(22.6,4.54) 74(19.601,38.46) 74(22.6,1.46) 75(20.001,41.54) 75(23,4.54) 76(20.001,38.46) 76(23,1.46) 77(20.401,41.54) 77(23.4,4.54) 78(20.401,38.46) 78(23.4,1.46) 79(20.801,41.54) 79(23.8,4.54) 80(20.801,38.46) 80(23.8,1.46) 81(21.201,41.54) 81(24.2,4.54) 82(21.201,38.46) 82(24.2,1.46) 83(21.601,41.54) 83(24.6,4.54) 84(21.601,38.46) 84(24.6,1.46) 85(22.001,41.54) 85(25,4.54) 86(22.001,38.46) 86(25,1.46) 87(22.401,41.54) 87(25.4,4.54) 88(22.401,38.46) 88(25.4,1.46) 89(22.801,41.54) 89(25.8,4.54) 90(22.801,38.46) 90(25.8,1.46) 91(23.201,41.54) 91(26.2,4.54) 92(23.201,38.46) 92(26.2,1.46) 93(23.601,41.54) 93(26.6,4.54) 94(23.601,38.46) 94(26.6,1.46) 95(24.001,41.54) 95(27,4.54) 96(24.001,38.46) 96(27,1.46) 97(24.401,41.54) 97(27.4,4.54) 98(24.401,38.46) 98(27.4,1.46) 99(24.801,41.54) 99(27.8,4.54) 100(24.801,38.46) 100(27.8,1.46)
Top Layer keep-out:
  circle w0.1: c2.9,7.9 r2.75
  circle w0.1: c27.101,32.1 r2.75
Top Overlay:
  circle w0.254: c7.15,5 r0.025
  circle w0.254: c4.151,42 r0.025
  lines w0.1: -0.001,42.997 cw(c1.999,42.997) 1.999,44.997 ; 0,2 0,42.997 ; 0.006,2 ccw(c2.006,2) 2.006,0 28.001,0 ccw(c28.001,2) 30.001,2 30.001,42.993 ccw(c28.001,42.993) 28.001,44.993 ; 1.999,45 28.001,45
  lines w0.102: 5.086,42.75 5.201,42.25 5.316,42.75 ; 8.085,5.75 8.2,5.25 8.315,5.75
  lines w0.2: 4.151,39.35 25.851,39.35 25.851,40.65 4.151,40.65 4.151,39.35 ; 7.15,2.35 28.85,2.35 28.85,3.65 7.15,3.65 7.15,2.35
  text "Connector B" at 15.359,0.429 h1
  text "Connector A" at 12.089,42.429 h1
Top Assembly:
  circle w0.1: c2.9,7.9 r2.85
  circle w0.1: c7.95,3.25 r0.4
  circle w0.1: c27.101,32.1 r2.85
  circle w0.1: c4.951,40.25 r0.4
  lines w0.1: 4.151,38.95 25.851,38.95 25.851,41.05 4.151,41.05 4.151,38.95 ; 7.15,1.95 28.85,1.95 28.85,4.05 7.15,4.05 7.15,1.95
  text "'.Designator'" at 18,3 h1
  text "'.Designator'" at 15.001,40 h1
Top Courtyard (Mech15):
  circle w0.05: c27.101,32.1 r2.85
  circle w0.05: c27.101,32.1 r2.85
  circle w0.05: c2.9,7.9 r2.85
  circle w0.05: c2.9,7.9 r2.85
  lines w0.05: 2.546,7.546 3.254,8.254 ; 2.546,8.254 3.254,7.546 ; 26.747,31.746 27.454,32.454 ; 26.747,32.454 27.454,31.746 ; 3.501,37.75 3.501,42.25 26.501,42.25 26.501,37.75 3.501,37.75 ; 6.5,0.75 6.5,5.25 29.5,5.25 29.5,0.75 6.5,0.75 ; 14.501,40 15.501,40 14.501,40 ; 15.001,39.5 15.001,40.5 15.001,39.5 ; 17.5,3 18.5,3 17.5,3 ; 18,2.5 18,3.5 18,2.5
Top Component Outline (Mech31):
  lines w0.1: 3.706,38.31 26.306,38.31 26.306,41.69 3.706,41.69 3.706,38.31 ; 6.705,1.31 29.305,1.31 29.305,4.69 6.705,4.69 6.705,1.31
3D body "DF40HC(3.0)-100DS-0.4V.stp": height 2.85, standoff -0.05, extent 3.706,38.31 26.306,41.69
3D body "DF40HC(3.0)-100DS-0.4V.stp": height 2.85, standoff -0.05, extent 6.705,1.31 29.305,4.69